# Altium footprint library PCB封装库.PcbLib: 109 footprints (part 1 of 7)
Each footprint in its own frame and in the unit in brackets; x right, y up, seen from the top. Pads: shape width x height; smd on the part's side, far side on the other; paste and mask are expansions set on the pad; w line width, h text height; cw(c..) or ccw(c..) is an arc to the next point about the centre after c.
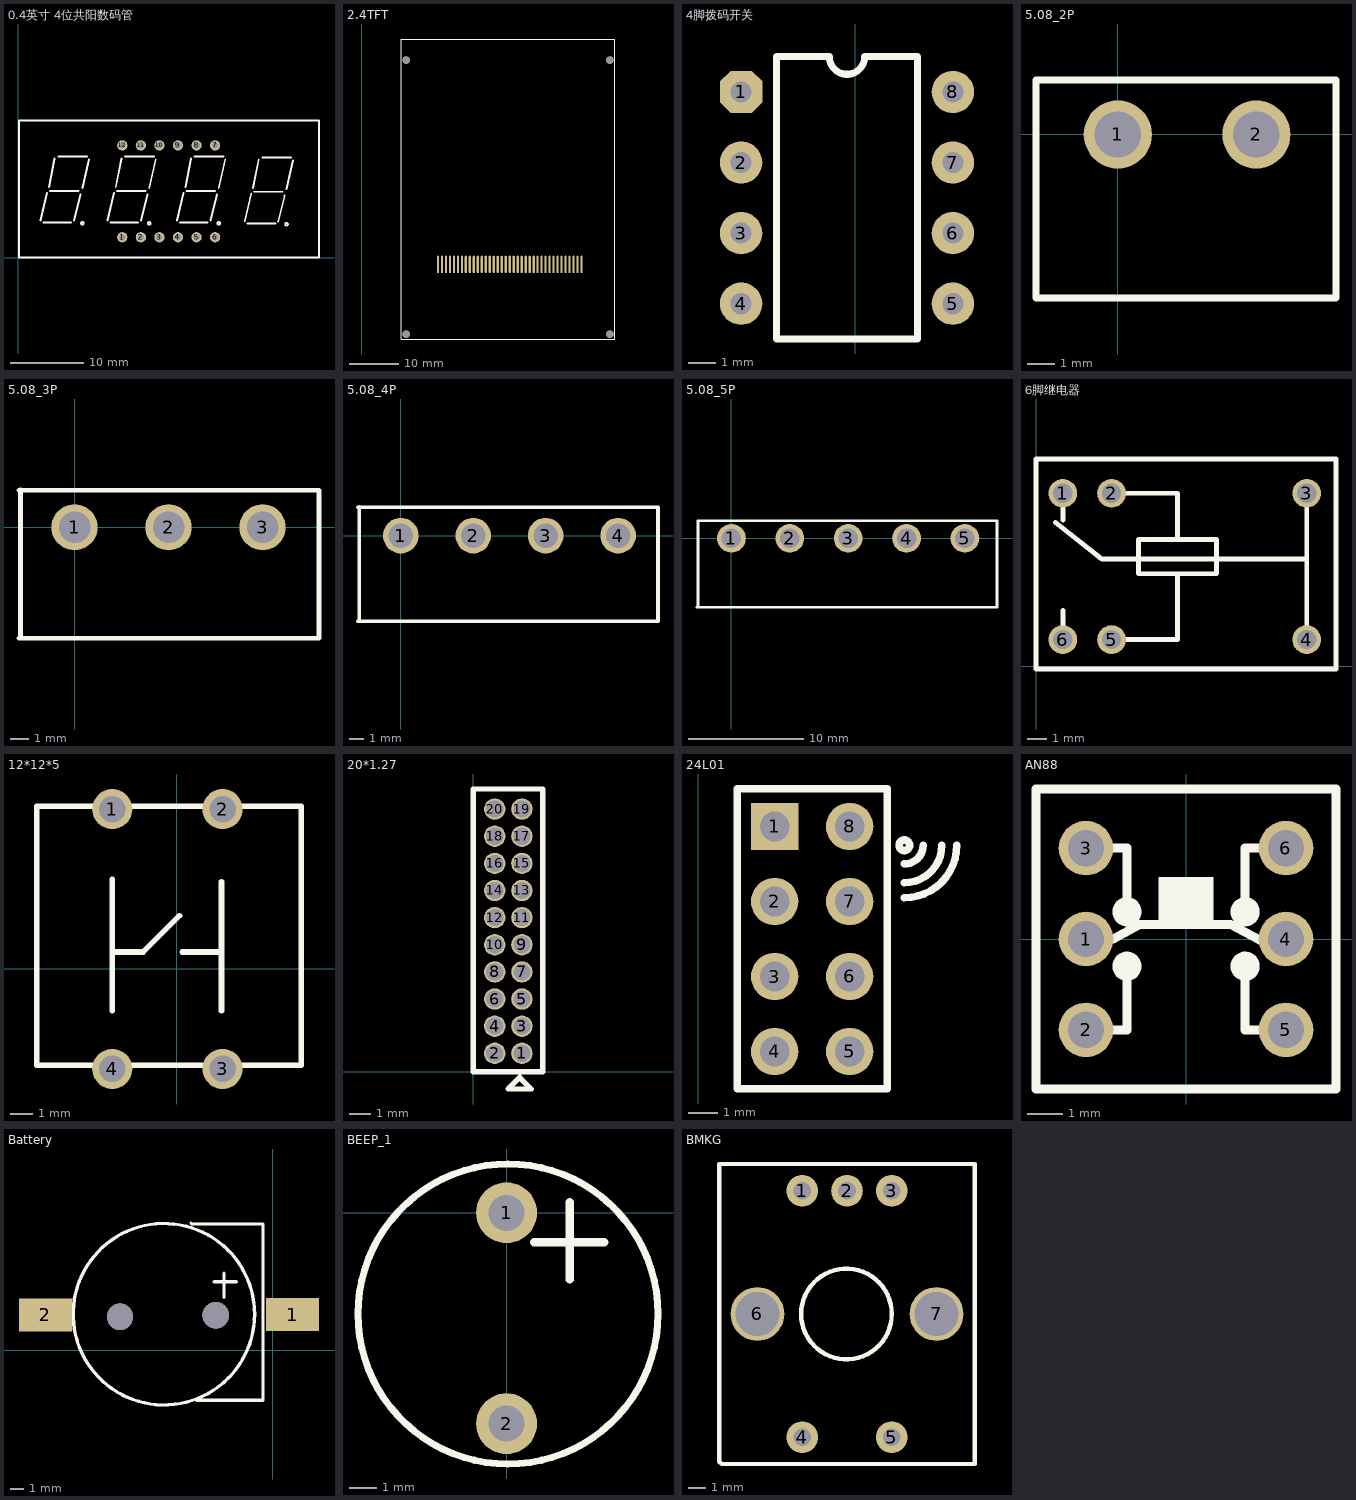
[diagram p0: the footprints below, top view; thin cyan lines are the x and y axes]

## 0.4英寸 4位共阳数码管 [mm]
pads (12):
  round 1.4 hole 0.9: 1(14.224,2.794) 2(16.764,2.794) 3(19.304,2.794) 4(21.844,2.794) 5(24.384,2.794) 6(26.924,2.794) 7(26.924,15.367) 8(24.384,15.367) 9(21.844,15.367) 10(19.304,15.367) 11(16.764,15.367) 12(14.224,15.367)
Top Overlay:
  lines w0.254: 3.048,5.08 3.937,8.89 ; 3.429,4.826 3.683,4.826 7.239,4.826 ; 4.191,9.652 4.953,13.589 ; 4.318,9.144 8.255,9.144 ; 5.461,13.843 9.398,13.843 ; 7.62,5.08 8.509,8.636 ; 8.763,4.879 ccw(c8.763,4.699) 8.843,4.86 ; 8.763,9.525 9.652,13.462 ; 12.192,5.08 13.081,8.89 ; 12.573,4.826 12.827,4.826 16.383,4.826 ; 13.335,9.652 14.097,13.589 ; 13.462,9.144 17.399,9.144 ; 14.605,13.843 18.542,13.843 ; 16.764,5.08 17.653,8.636 ; 17.907,4.879 ccw(c17.907,4.699) 17.987,4.86 ; 17.907,9.525 18.796,13.462 ; 21.717,5.08 22.606,8.89 ; 22.098,4.826 22.352,4.826 25.908,4.826 ; 22.86,9.652 23.622,13.589 ; 22.987,9.144 26.924,9.144 ; 24.13,13.843 28.067,13.843 ; 26.289,5.08 27.178,8.636 ; 27.432,4.879 ccw(c27.432,4.699) 27.512,4.86 ; 27.432,9.525 28.321,13.462 ; 30.988,4.953 31.877,8.763 ; 31.369,4.699 31.623,4.699 35.179,4.699 ; 32.131,9.525 32.893,13.462 ; 32.258,9.017 36.195,9.017 ; 33.401,13.716 37.338,13.716 ; 35.56,4.953 36.449,8.509 ; 36.703,4.752 ccw(c36.703,4.572) 36.783,4.733 ; 36.703,9.398 37.592,13.335 ; 0.086,0 40.64,0 41.148,0 41.148,18.796 0.254,18.796 0.086,18.796 0.086,0

## 2.4TFT [mm]
pads (41):
  oval 0.45x3.5 smd: 1(44.116,19.028) 2(43.316,19.028) 3(42.516,19.028) 4(41.716,19.028) 5(40.916,19.028) 6(40.116,19.028) 7(39.316,19.028) 8(38.516,19.028) 9(37.716,19.028) 10(36.916,19.028) 11(36.116,19.028) 12(35.316,19.028) 13(34.516,19.028) 14(33.716,19.028) 15(32.916,19.028) 16(32.116,19.028) 17(31.316,19.028) 18(30.516,19.028) 19(29.716,19.028) 20(28.916,19.028) 21(28.116,19.028) 22(27.316,19.028) 23(26.516,19.028) 24(25.716,19.028) 25(24.916,19.028) 26(24.116,19.028) 27(23.316,19.028) 28(22.516,19.028) 29(21.716,19.028) 30(20.916,19.028) 31(20.116,19.028) 32(19.316,19.028) 33(18.516,19.028) 34(17.716,19.028) 35(16.916,19.028) 36(16.116,19.028) 37(15.316,19.028)
  round 1.5 hole 1.5: 40(8.916,60.028) 41(49.816,60.028) 42(49.816,5.028) 43(8.916,5.028)
Top Overlay:
  lines w0.152: 7.972,4.064 50.772,4.064 50.772,64.264 7.972,64.264 7.972,4.064
3D body: height 2.6, standoff -0.1, extent 12.736,11.938 46.736,58.166

## 4脚拨码开关 [mil]
pads (8):
  oct 60x60 hole 30: 1(-162,491)
  round 60 hole 30: 2(-162,391) 3(-162,291) 4(-162,191) 5(138,191) 6(138,291) 7(138,391) 8(138,491)
Top Overlay:
  lines w10: -112,141 88,141 88,541 13,541 cw(c-12,541) -37,541 -112,541 -112,141
3D body: height 296, standoff -101, extent -203,119 177,569

## 5.08_2P [mm]
pads (2):
  round 2.5 hole 1.7: 1(0,0) 2(5.08,0)
Top Overlay:
  lines w0.254: -2,2 8,2 8,-6 -3,-6 -3,2 -1,2

## 5.08_3P [mm]
pads (3):
  round 2.5 hole 1.7: 1(0,0) 2(5.08,0) 3(10.16,0)
Top Overlay:
  lines w0.254: -3,-6 13.208,-6 13.208,2 -2,2 ; -3,2 -1,2 ; -2.921,-5.968 -2.921,2.032

## 5.08_4P [mm]
pads (4):
  round 2.5 hole 1.7: 1(0,0) 2(5.08,0) 3(10.16,0) 4(15.24,0)
Top Overlay:
  lines w0.254: -3,-6 18.034,-6 18.034,2 -2,2 ; -3,2 -1,2 ; -2.921,-5.968 -2.921,2.032

## 5.08_5P [mm]
pads (5):
  round 2.5 hole 1.7: 1(0,0) 2(5.08,0) 3(10.16,0) 4(15.24,0) 5(20.32,0)
Top Overlay:
  lines w0.254: -3,-6 23.114,-6 23.114,1.524 -2,1.524 ; -2.921,-5.968 -2.921,1.524 -1,1.524

## 6脚继电器 [mm]
pads (6):
  round 1.5 hole 1: 1(1.397,9.017) 2(3.937,9.017) 3(14.097,9.017) 4(14.097,1.397) 5(3.937,1.397) 6(1.397,1.397)
Top Overlay:
  lines w0.254: 1.016,7.493 3.429,5.588 14.097,5.588 14.097,9.017 14.097,1.397 ; 1.397,1.397 1.397,2.921 ; 1.397,7.62 1.397,9.017 ; 3.937,9.017 5.715,9.017 7.366,9.017 7.366,6.731 7.366,6.604 5.334,6.604 5.334,4.826 9.398,4.826 9.398,6.604 6.604,6.604 ; 4.064,1.397 3.937,1.397 7.366,1.397 7.366,4.826 ; 0,-0.127 0,10.795 15.621,10.795 15.621,-0.127 0,-0.127

## 10*2*1.27 [mm]

## 12*12*5 [mm]
pads (4):
  round 1.824 hole 1.2: 1(-2.921,7.239) 2(2.079,7.239) 3(2.079,-4.539) 4(-2.921,-4.539)
Top Overlay:
  lines w0.254: -2.921,-1.905 -2.921,4.064 ; -2.794,0.762 -1.524,0.762 0.127,2.413 ; 0.254,0.762 1.905,0.762 ; 2.032,-1.905 2.032,3.937 ; -6.35,-4.38 -6.35,7.366 5.65,7.366 5.65,-4.38 -6.35,-4.38
3D body: height 4.55, standoff -2.9, extent -3.175,-1.905 2.825,4.699

## 20*1.27 [mm]
pads (20):
  round 1 hole 0.8: 1(2.27,0.86) 2(1,0.86) 3(2.27,2.13) 4(1,2.13) 5(2.27,3.4) 6(1,3.4) 7(2.27,4.67) 8(1,4.67) 9(2.27,5.94) 10(1,5.94) 11(2.27,7.21) 12(1,7.21) 13(2.27,8.48) 14(1,8.48) 15(2.27,9.75) 16(1,9.75) 17(2.27,11.02) 18(1,11.02) 19(2.27,12.29) 20(1,12.29)
Top Overlay:
  lines w0.254: 3.24,0.81 3.24,1.08 ; 0,0 3.24,0 3.24,13.23 0,13.23 0,0 ; 1.62,-0.81 2.7,-0.81 2.16,-0.27 1.62,-0.81

## 24L01 [mm]
pads (8):
  rect 1.6x1.6 hole 1: 1(2.591,11.735)
  round 1.6 hole 1: 2(2.591,9.195) 3(2.591,6.655) 4(2.591,4.115) 5(5.131,4.115) 6(5.131,6.655) 7(5.131,9.195) 8(5.131,11.735)
Top Overlay:
  circle w0.254: c6.983,11.1 r0.18
  lines w0.254: 6.983,9.322 ccw(c6.983,11.1) 8.761,11.1 ; 6.983,9.83 ccw(c6.983,11.1) 8.253,11.1 ; 6.983,10.465 ccw(c6.983,11.1) 7.618,11.1 ; 1.321,2.845 6.401,2.845 6.401,13.005 1.321,13.005 1.321,2.845
3D body: height 8.54, standoff -3, extent 1.289,2.8 3.829,12.96
3D body: height 8.54, standoff -3, extent 3.829,2.8 6.369,12.96

## AN88 [mil]
pads (6):
  round 60 hole 40: 1(-110,0) 2(-110,-100) 3(-110,100) 4(110,0) 5(110,-100) 6(110,100)
Top Overlay:
  circle w18: c-65,-30 r7.07
  circle w18: c65,-30 r7.07
  circle w18: c65,30 r7.07
  circle w18: c-65,30 r7.07
  rectangle: -30,16 30,68
  lines w10: -110,-100 -65,-100 -65,-40 ; -110,0 -80,0 -51,16 49,16 81,-1 109,-1 110,0 ; -110,100 -65,100 -65,30 ; 65,-40 65,-100 110,-100 ; 65,40 65,100 110,100 ; -165,-165 165,-165 165,165 -165,165 -165,-165
3D body: height 511.81, standoff -157.48, extent -135.59,-132.8 140,142.8

## Battery [mm]
pads (2):
  rect 4x2.5 smd: 1(1.499,2.718) 2(-17.196,2.692)
via -11.557,2.54 diameter 2 hole 2
via -4.318,2.667 diameter 2 hole 2
Top Overlay:
  circle w0.254: c-8.236,2.743 r6.864
  lines w0.245: -6.185,9.639 -6.121,9.576 -0.737,9.576 -0.737,-0.864 -0.737,-3.759 ; -5.74,-3.759 -0.838,-3.759 ; -4.445,5.207 -2.769,5.207 ; -3.683,4.013 -3.683,5.842
3D body: height 0.5, standoff -4.44, extent -17.632,-4.572 0.868,10.425

## BEEP_1 [mm]
pads (2):
  round 2.2 hole 1.3: 1(0,0) 2(0,-7.62)
Top Overlay:
  circle w0.254: c0.051,-3.658 r5.42
  lines w0.3: 0.991,-1.067 3.531,-1.067 ; 2.286,-2.413 2.286,0.381
3D body: height 9.65, standoff -4.5, extent -6,-9.779 6,5.675

## BMKG [mil]
pads (7):
  round 70.87 hole 39.37: 1(374,686) 2(474,686) 3(574,686) 4(374,136) 5(574,136)
  round 120 hole 98.43: 6(274,411) 7(674,411)
Top Overlay:
  circle w10: c472.76,411 r101.24
  lines w10: 189,81 189,746 199,746 759,746 759,76 194,76 189,81
3D body: height 7.87, standoff -1003.94, extent 184.73,71 775.28,779.66